# Altium footprint library DrPCB.PcbLib: 910 footprints (part 30 of 57)
Each footprint in its own frame and in the unit in brackets; x right, y up, seen from the top. Pads: shape width x height; smd on the part's side, far side on the other; paste and mask are expansions set on the pad; w line width, h text height; cw(c..) or ccw(c..) is an arc to the next point about the centre after c.
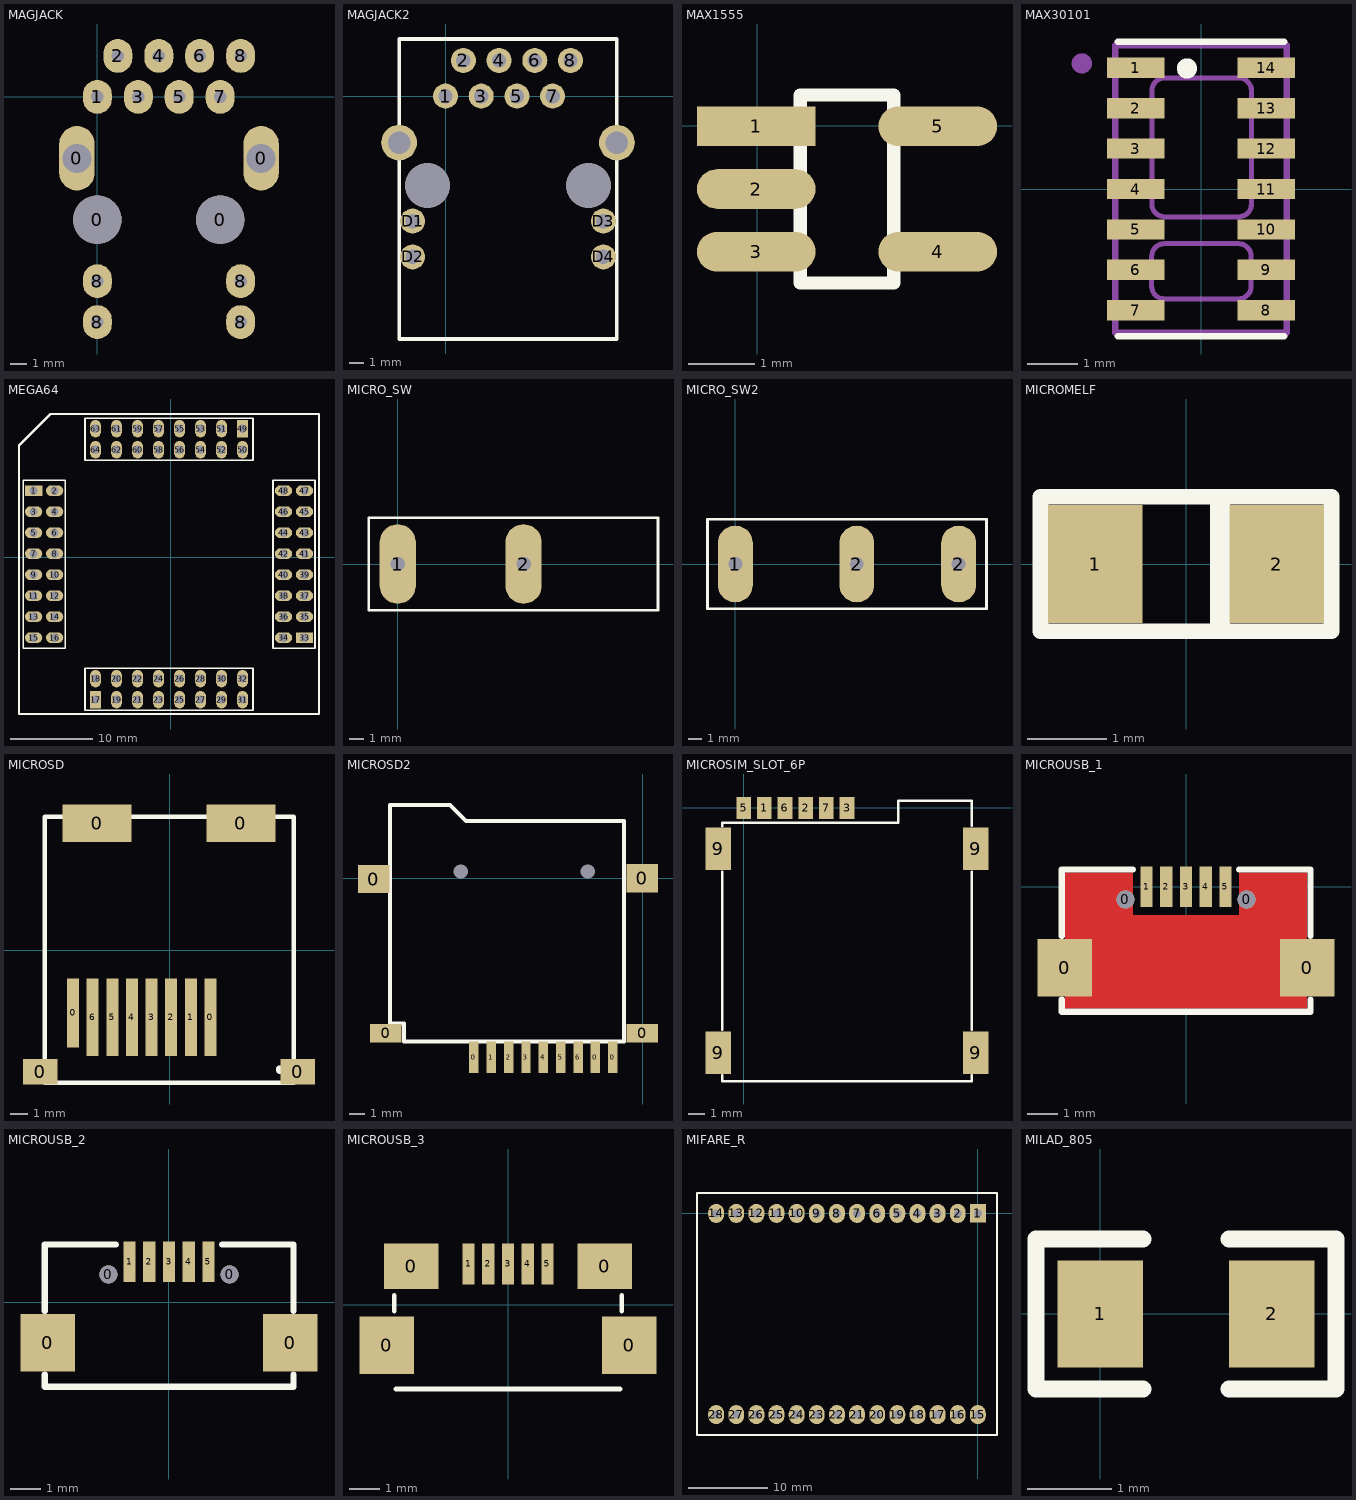
[diagram p29: the footprints below, top view; thin cyan lines are the x and y axes]

## MAGJACK [mm]
pads (16):
  oval 2.2x4 hole 1.8: 0(-1.27,-3.81) 0(10.16,-3.81)
  round 3 hole 3: 0(0,-7.62) 0(7.62,-7.62)
  oval 1.8x2.1 hole 0.762: 1(0,0) 2(1.27,2.54) 3(2.54,0) 4(3.81,2.54) 5(5.08,0) 6(6.35,2.54) 7(7.62,0) 8(0,-13.97) 8(0,-11.43) 8(8.89,-13.97) 8(8.89,-11.43) 8(8.89,2.54)

## MAGJACK2 [mil]
pads (16):
  round 70 hole 40: 1(0,0) 2(50,100) 3(100,0) 4(150,100) 5(200,0) 6(250,100) 7(300,0) 8(350,100) D1(-92,-350) D2(-92,-450) D3(442,-350) D4(442,-450)
  round 100 hole 63: ""(-130,-130) ""(480,-130)
  round 60 hole 126: ""(-50,-250) ""(400,-250)
Top Overlay:
  lines w10: -130,-680 480,-680 480,-45 480,160 -130,160 -130,-385 -130,-680

## MAX1555 [mm]
pads (5):
  rect 1.8x0.6 smd: 1(-0.013,-0.013)
  oval 1.8x0.6 smd: 2(-0.013,-0.963) 3(-0.013,-1.913) 4(2.737,-1.913) 5(2.737,-0.013)
Top Overlay:
  lines w0.2: 1.125,0.462 2.072,0.462 2.072,-2.388 0.652,-2.388 0.652,0.462 1.6,0.462

## MAX30101 [mm]
pads (14):
  rect 1.14x0.4 smd: 1(-1.295,2.4) 2(-1.295,1.6) 3(-1.295,0.8) 4(-1.295,0) 5(-1.295,-0.8) 6(-1.295,-1.6) 7(-1.295,-2.4) 8(1.295,-2.4) 9(1.295,-1.6) 10(1.295,-0.8) 11(1.295,0) 12(1.295,0.8) 13(1.295,1.6) 14(1.295,2.4)
Top Overlay:
  circle w0.2: c-0.279,2.388 r0.1
  lines w0.127: -1.65,-2.914 1.65,-2.914 ; -1.65,2.914 1.65,2.914
Mechanical 13:
  circle w0.2: c-2.361,2.488 r0.1
  lines w0.1: -0.978,-1.926 ccw(c-0.728,-1.926) -0.728,-2.176 0.742,-2.176 ccw(c0.742,-1.926) 0.992,-1.926 0.992,-1.332 ccw(c0.742,-1.332) 0.742,-1.082 -0.728,-1.082 ccw(c-0.728,-1.332) -0.978,-1.332 -0.978,-1.926 ; -0.973,-0.3 ccw(c-0.723,-0.3) -0.723,-0.55 0.747,-0.55 ccw(c0.747,-0.3) 0.997,-0.3 0.997,1.95 ccw(c0.747,1.95) 0.747,2.2 -0.723,2.2 ccw(c-0.723,1.95) -0.973,1.95 -0.973,-0.3
  lines w0.127: -1.7,-2.85 -1.7,2.85 1.7,2.85 1.7,-2.85 -1.7,-2.85
3D body "User Library-MAX30101.step": height 1.52, standoff -0.03, extent -1.65,-2.8 1.65,2.8

## MEGA64 [mm]
pads (64):
  rect 2.1x1.3 hole 1: 1(-16.561,8.026) 33(16.205,-9.754)
  oval 2.1x1.3 hole 1: 2(-14.021,8.026) 3(-16.561,5.486) 4(-14.021,5.486) 5(-16.561,2.946) 6(-14.021,2.946) 7(-16.561,0.406) 8(-14.021,0.406) 9(-16.561,-2.134) 10(-14.021,-2.134) 11(-16.561,-4.674) 12(-14.021,-4.674) 13(-16.561,-7.214) 14(-14.021,-7.214) 15(-16.561,-9.754) 16(-14.021,-9.754) 34(13.665,-9.754) 35(16.205,-7.214) 36(13.665,-7.214) 37(16.205,-4.674) 38(13.665,-4.674) 39(16.205,-2.134) 40(13.665,-2.134) 41(16.205,0.406) 42(13.665,0.406) 43(16.205,2.946) 44(13.665,2.946) 45(16.205,5.486) 46(13.665,5.486) 47(16.205,8.026) 48(13.665,8.026)
  rect 1.3x2.1 hole 1: 17(-9.068,-17.247) 49(8.712,15.519)
  oval 1.3x2.1 hole 1: 18(-9.068,-14.707) 19(-6.528,-17.247) 20(-6.528,-14.707) 21(-3.988,-17.247) 22(-3.988,-14.707) 23(-1.448,-17.247) 24(-1.448,-14.707) 25(1.092,-17.247) 26(1.092,-14.707) 27(3.632,-17.247) 28(3.632,-14.707) 29(6.172,-17.247) 30(6.172,-14.707) 31(8.712,-17.247) 32(8.712,-14.707) 50(8.712,12.979) 51(6.172,15.519) 52(6.172,12.979) 53(3.632,15.519) 54(3.632,12.979) 55(1.092,15.519) 56(1.092,12.979) 57(-1.448,15.519) 58(-1.448,12.979) 59(-3.988,15.519) 60(-3.988,12.979) 61(-6.528,15.519) 62(-6.528,12.979) 63(-9.068,15.519) 64(-9.068,12.979)
Top Overlay:
  lines w0.2: -17.831,-11.024 -17.831,9.296 -12.751,9.296 -12.751,-11.024 -17.831,-11.024 ; -10.338,-18.517 9.982,-18.517 9.982,-13.437 -10.338,-13.437 -10.338,-18.517 ; -10.338,11.709 9.982,11.709 9.982,16.789 -10.338,16.789 -10.338,11.709 ; 12.395,-11.024 12.395,9.296 17.475,9.296 17.475,-11.024 12.395,-11.024
  lines w0.254: -18.326,-18.986 17.958,-18.986 17.958,17.297 -14.516,17.297 -18.326,13.487 -18.326,-18.986

## MICRO_SW [mm]
pads (2):
  oval 2.5x5.5 hole 1: 1(0,0) 2(8.7,0)
Top Overlay:
  lines w0.2: -2.007,-3.2 17.993,-3.2 17.993,3.2 -2.007,3.2 -2.007,-3.2
3D body "Switch.STEP": height 15.38, standoff -3.59, extent -2.007,-3.2 17.993,3.2

## MICRO_SW2 [mm]
pads (3):
  oval 2.5x5.5 hole 1: 1(0,0) 2(8.7,0) 2(16,0)
Top Overlay:
  lines w0.2: -2.007,-3.2 -2.007,3.2 17.993,3.2 17.993,-3.2 -2.007,-3.2
3D body "Switch.STEP": height 15.38, standoff -3.59, extent -2.007,-3.2 17.993,3.2

## MICROMELF [mm]
pads (2):
  rect 1.2x1.5 smd: 1(-1.15,0) 2(1.15,0)
Top Overlay:
  lines w0.2: -1.841,-0.851 -1.841,0.851 1.841,0.851 1.841,-0.851 -1.841,-0.851
  lines w0.254: 0.432,-0.826 0.432,0.826

## MICROSD [mm]
pads (12):
  rect 2x1.5 smd: 0(-7.531,-7.08) 0(7.455,-7.08)
  rect 0.7x4 smd: 0(-5.626,-3.651)
  rect 4x2.2 smd: 0(-4.229,7.398) 0(4.153,7.398)
  rect 0.7x4.5 smd: 0(2.375,-3.905) 1(1.232,-3.905) 2(0.089,-3.905) 3(-1.054,-3.905) 4(-2.197,-3.905) 5(-3.34,-3.905) 6(-4.483,-3.905)
Top Overlay:
  circle w0.254: c6.439,-6.953 r0.127
  lines w0.254: -7.277,-7.721 7.223,-7.721 7.223,7.779 -7.277,7.779 -7.277,-7.721

## MICROSD2 [mm]
pads (15):
  rect 2x1.8 smd: 0(-17.043,-0.051) 0(-0.025,-0.01)
  rect 2x1.2 smd: 0(-16.281,-9.83) 0(-0.025,-9.83)
  rect 0.6x2 smd: 0(-10.693,-11.354) 0(-2.993,-11.354) 0(-1.893,-11.354) 1(-9.593,-11.354) 2(-8.493,-11.354) 3(-7.393,-11.354) 4(-6.293,-11.354) 5(-5.193,-11.354) 6(-4.093,-11.354)
  round 0 hole 0.9: 13(-11.532,0.432) 14(-3.48,0.432)
Top Overlay:
  lines w0.254: -16.027,-9.195 -15.138,-9.195 -15.138,-10.338 -1.168,-10.338 -1.168,3.632 -11.201,3.632 -12.217,4.648 -13.106,4.648 -16.027,4.648 -16.027,-9.195

## MICROSIM_SLOT_6P [mm]
pads (10):
  rect 0.9x1.35 smd: 1(1.27,0) 2(3.81,0) 3(6.35,0) 5(0,0) 6(2.54,0) 7(5.08,0)
  rect 1.55x2.6 smd: 9(-1.56,-15.025) 9(-1.56,-2.505) 9(14.25,-15.025) 9(14.25,-2.505)
Top Overlay:
  lines w0.15: -1.305,-16.396 -1.305,-16.776 13.995,-16.776 13.995,-16.396 ; -1.305,-13.627 -1.305,-3.912 ; -1.305,-1.13 -1.305,-0.926 9.487,-0.926 ; 9.495,-0.909 9.495,0.424 13.995,0.424 13.995,-1.092 ; 13.995,-13.627 13.995,-3.912
3D body "User Library-MICRO 1_35 SIM (CD).step": height 1.45, standoff 0.01, extent -1.849,-16.79 14.651,0.42

## MICROUSB_1 [mm]
pads (9):
  rect 1.8x1.9 smd: 0(-4,-2.675) 0(4,-2.675)
  round 0.6 hole 0.6: 0(-2,-0.419) 0(2,-0.419)
  rect 0.4x1.35 smd: 1(-1.3,0) 2(-0.65,0) 3(0,0) 4(0.65,0) 5(1.3,0)
Top Layer:
  rectangle: -1.816,-4.026 1.778,-0.925
  rectangle: 1.75,-4.026 4,0.47
  rectangle: -4,-4.026 -1.75,0.47
Top Overlay:
  lines w0.2: -4.1,-3.721 -4.1,-4.125 4.102,-4.125 4.102,-3.721 ; -4.1,-1.626 -4.1,0.572 -1.753,0.571 ; 1.753,0.572 4.1,0.572 ; 4.102,-1.626 4.102,0.572

## MICROUSB_2 [mm]
pads (9):
  rect 1.8x1.9 smd: 0(-4,-1.338) 0(4,-1.338)
  round 0.6 hole 0.6: 0(-2,0.918) 0(2,0.918)
  rect 0.4x1.35 smd: 1(-1.3,1.338) 2(-0.65,1.338) 3(0,1.338) 4(0.65,1.338) 5(1.3,1.338)
Top Overlay:
  lines w0.2: -4.1,-2.384 -4.1,-2.788 4.102,-2.788 4.102,-2.384 ; -4.1,-0.288 -4.1,1.909 -1.753,1.909 ; 1.753,1.909 4.1,1.91 ; 4.102,-0.288 4.102,1.909
3D body "User Library-Micro USB.STEP": height 2.71, standoff -0.23, extent -3.99,-3.936 3.99,1.494

## MICROUSB_3 [mm]
pads (9):
  rect 1.8x1.9 smd: 0(-4,-1.337) 0(4,-1.337)
  rect 1.8x1.5 smd: 0(-3.2,1.263) 0(3.2,1.263)
  rect 0.4x1.35 smd: 1(-1.3,1.338) 2(-0.65,1.338) 3(0,1.338) 4(0.65,1.338) 5(1.3,1.338)
Top Overlay:
  lines w0.15: -3.75,-0.216 -3.75,0.305 ; -3.696,-2.787 3.696,-2.787 ; 3.75,-0.216 3.75,0.305
3D body "User Library-Micro USB.STEP": height 2.71, standoff -0.23, extent -3.99,-3.936 3.99,1.494

## MIFARE_R [mm]
pads (28):
  rect 2x2.3 hole 1: 1(-0.013,0.013)
  oval 2x2.4 hole 1: 2(-2.553,0.013) 3(-5.093,0.013) 4(-7.633,0.013) 5(-10.173,0.013) 6(-12.713,0.013) 7(-15.253,0.013) 8(-17.793,0.013) 9(-20.333,0.013) 10(-22.873,0.013) 11(-25.413,0.013) 12(-27.953,0.013) 13(-30.493,0.013) 14(-33.033,0.013) 15(-0.013,-25.387) 16(-2.553,-25.387) 17(-5.093,-25.387) 18(-7.633,-25.387) 19(-10.173,-25.387) 20(-12.713,-25.387) 21(-15.253,-25.387) 22(-17.793,-25.387) 23(-20.333,-25.387) 24(-22.873,-25.387) 25(-25.413,-25.387) 26(-27.953,-25.387) 27(-30.493,-25.387) 28(-33.033,-25.387)
Top Overlay:
  lines w0.254: -35.446,-27.902 -35.446,2.553 2.388,2.553 2.4,2.54 2.4,-27.927 -35.42,-27.927 -35.446,-27.902

## MILAD_805 [mil]
pads (2):
  rect 40x50 smd: 1(0,0) 2(80,0)
Top Overlay:
  lines w8: 20,-35 -30,-35 -30,35 20,35 ; 60,-35 110,-35 110,35 60,35